# Altium integrated library LED-SMD_V2.IntLib: 212 symbols
Pins are listed as number, name and electrical type; pins without a type are passive.

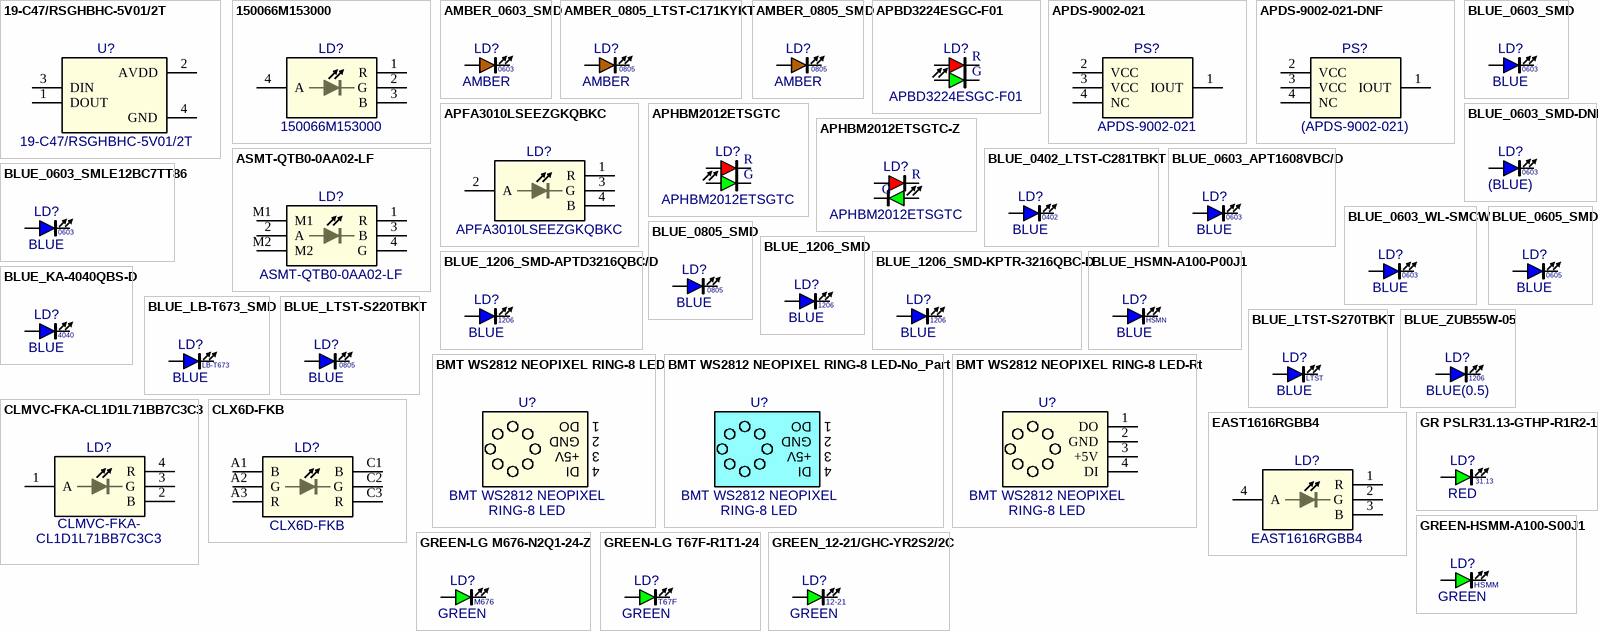
[diagram p0: symbols 19-C47/RSGHBHC-5V01/2T to GREEN_12-21/GHC-YR2S2/2C]

## 19-C47/RSGHBHC-5V01/2T
designator U?
IC Addressable Lighting LED; Manufacturer: Everlight; Package: LED-PLCC4-1.8x1.8-19-C47; EDM-PN: *; Text2: *; Text1: *; Value: 19-C47/RSGHBHC-5V01/2T; SAAB PN: *; DCE Part No: *; Part Number: 19-C47/RSGHBHC-5V01/2T
footprint LED-PLCC4-1.8x1.8-19-C47 (PLCC4 1.8x1.8mm)
pins: 1 DOUT, 2 AVDD, 3 DIN, 4 GND

## 150066M153000
designator LD?
LED Tri Colour RGB; Manufacturer: Wurth; Part Number: 150066M153000; Package: WL-SFCD-0606; EDM-PN: *; SAAB PN: *; DCE Part No: *; Value: 150066M153000
footprint WL-SFCD-0606 (WL-SFCD-0606 1.6x1.6mm)
pins: 1 R, 2 G, 3 B, 4 A

## AMBER_0603_SMD
designator LD?  value AMBER  Text2: 0603  (hidden comment: AMBER_0603_SMD)
LED SMD 0603 Amber; Manufacturer: Various; Part Number: AMBER_0603_SMD; Package: LED0603-AMBER; EDM-PN: *; Text1: *; Reutech PN: *; SAAB PN: *; DCE Part No: *
footprint LED0603-Amber (LED 0603 Amber)
pins: 1 K, 2 A

## AMBER_0805_LTST-C171KYKT
designator LD?, comment value AMBER  Text2: 0805  (hidden comment: LTST-C171KYKT)
LED SMD 0805 Amber; Manufacturer: LITEON; Reutech PN: 5961-LE-0107; Part Number: LTST-C171KYKT; Package: LED0805_Orange; EDM-PN: *; Text1: *; SAAB PN: *; DCE Part No: *
footprint LED0805-Orange (LED, 0805, 2-Leads, Body 2.0x1.3mm, IPC Medium Density)
pins: 1 K, 2 A

## AMBER_0805_SMD
designator LD?  value AMBER  Text2: 0805  (hidden comment: AMBER_0805_SMD)
LED SMD 0805 Amber; Manufacturer: Various; Part Number: AMBER_0805_SMD; Package: LED0805-AMBER; EDM-PN: *; Text1: *; SAAB PN: *; DCE Part No: *
footprint LED0805-AMBER (LED 0805 Amber)
pins: 1 K, 2 A

## APBD3224ESGC-F01
designator LD?
LED SMD Red/Green Bicolor; Manufacturer: Kingbright; Part Number: APBD3224ESGC-F01; Package: LED-DUAL-3.2X2.4; EDM-PN: *; SAAB PN: *; Text1: *; Value: APBD3224ESGC-F01; DCE Part No: *
footprint LED-Dual-3.2x2.4 (LED Dual 3.2x2.4mm)
pins: 1 RA, 2 RK, 3 GA, 4 GK
text: R; G

## APDS-9002-021
designator PS?
Photo Sensor; Manufacturer: Avago; Part Number: APDS-9002-021; Package: ADPS-9002; EDM-PN: *; SAAB PN: *; Value: APDS-9002-021; DCE Part No: *
footprint APDS-9002 (Phot Sensor APDS SMD)
pins: 1 IOUT, 2 VCC (power), 3 VCC, 4 NC

## APDS-9002-021-DNF
designator PS?  value (APDS-9002-021)  (hidden comment: APDS-9002-021-DNF)
Photo Sensor - Do not Fit; Manufacturer: Avago; Part Number: DNF - APDS-9002-021; Package: ADPS-9002; EDM-PN: *; SAAB PN: *; DCE Part No: *
footprint APDS-9002 (Phot Sensor APDS SMD)
pins: 1 IOUT, 2 VCC (power), 3 VCC, 4 NC

## APFA3010LSEEZGKQBKC
designator LD?
LED Tri Colour Rt Angle RGB; Manufacturer: Kingbright; Part Number: APFA3010LSEEZGKQBKC; Package: APFA3010x; EDM-PN: *; SAAB PN: *; Value: APFA3010LSEEZGKQBKC; DCE Part No: *
footprint APFA3010x (APFA3010x Tricolor Right Angle 3.0x1.5mm)
pins: 1 R, 2 A, 3 G, 4 B

## APHBM2012ETSGTC
designator LD?
LED SMD Red/Green Bicolor; Manufacturer: Kingbright; Part Number: APHBM2012ETSGTC; Package: APHBM2012; EDM-PN: *; SAAB PN: *; Text1: *; Value: APHBM2012ETSGTC; DCE Part No: *
footprint APHBM2012 (APHBM2012 2.0x1.25mm)
pins: 1 RA, 2 RK, 3 GK, 4 GA
text: R; G

## APHBM2012ETSGTC-Z
designator LD?, comment APHBM2012ETSGTC
LED SMD Red/Green Bicolor; Manufacturer: Kingbright; Part Number: APHBM2012ETSGTC; Package: APHBM2012; EDM-PN: *; SAAB PN: *; Text1: *; Value: APHBM2012ETSGTC; DCE Part No: *
footprint APHBM2012 (APHBM2012 2.0x1.25mm)
pins: 1 RA, 2 RK, 3 GK, 4 GA
text: R; G

## ASMT-QTB0-0AA02-LF
designator LD?
LED SMD Tri Colour; Manufacturer: Avago; Part Number: ASMT-QTB0-0AA02-LF; Package: ASMT-SMD; EDM-PN: *; SAAB PN: *; Value: ASMT-QTB0-0AA02-LF; DCE Part No: *
footprint ASMT-SMD (Tri-Colour SMD LED)
pins: 1 R, 2 A, 3 B, 4 G, M1, M2

## BLUE_0402_LTST-C281TBKT
designator LD?, comment value BLUE  Text2: 0402  (hidden comment: LTST-C281TBKT)
LED SMD 0402 Blue; Manufacturer: LITEON; Part Number: LTST-C281TBKT; Package: LED0402-Blue; EDM-PN: *; Text1: *; Reutech PN: *; SAAB PN: *; DCE Part No: *
footprint LED0402-Blue (LED 0402 1.0x0.5mm)
pins: 1 K, 2 A

## BLUE_0603_APT1608VBC/D
designator LD?, comment value BLUE  Text2: 0603  (hidden comment: APT1608VBC/D)
LED SMD 0603 Blue; Manufacturer: Kingbright; Part Number: APT1608VBC/D; Package: LED0603-Blue; EDM-PN: *; Text1: *; Reutech PN: *; SAAB PN: *; DCE Part No: *
footprint LED0603-Blue (LED, 0603, 2-Leads, Body 1.6x0.8mm, IPC Medium Density)
pins: 1 K, 2 A

## BLUE_0603_SMD
designator LD?  value BLUE  Text2: 0603  (hidden comment: BLUE_0603_SMD)
LED SMD 0603 Blue; Manufacturer: Various; EDM-PN: LED49; Reutech PN: 5961-LE-0098; Part Number: BLUE_0603_SMD; Package: LED0603-Blue; Text1: *; SAAB PN: *; DCE Part No: *
footprint LED0603-Blue (LED, 0603, 2-Leads, Body 1.6x0.8mm, IPC Medium Density)
pins: 1 K, 2 A

## BLUE_0603_SMD-DNF
designator LD?, comment value (BLUE)  Text2: 0603  (hidden comment: BLUE_0603_SMD)
LED SMD 0603 Blue - Do not Fit; Manufacturer: Various; Part Number: DNT - BLUE_0603; EDM-PN: DNF; Reutech PN: 5961-LE-0098; Package: LED0603-Blue; Text1: *; SAAB PN: *; DCE Part No: *
footprint LED0603-Blue (LED, 0603, 2-Leads, Body 1.6x0.8mm, IPC Medium Density)
pins: 1 K, 2 A

## BLUE_0603_SMLE12BC7TT86
designator LD?, comment value BLUE  Text2: 0603  (hidden comment: SMLE12BC7TT86)
LED SMD 0603 Blue; Manufacturer: Rohm; EDM-PN: LED49; Part Number: SMLE12BC7TT86; Package: LED0603-Blue; Text1: *; Reutech PN: *; SAAB PN: *; DCE Part No: *
footprint LED0603-Blue (LED, 0603, 2-Leads, Body 1.6x0.8mm, IPC Medium Density)
pins: 1 K, 2 A

## BLUE_0603_WL-SMCW
designator LD?  value BLUE  Text2: 0603  (hidden comment: BLUE_0603_WL-SMCW)
LED SMD 0603 Blue 145mcd; Manufacturer: Wurth; Part Number: 150060BS75000; EDM-PN: LED157; Reutech PN: 5961-LE-; Package: WL-SMCW-0603-BLUE; Text1: *; SAAB PN: *; DCE Part No: *
footprint WL-SMCW-0603-BLUE (WL-SMCW-0603-BLUE 1.6x0.8mm)
pins: 1 K, 2 A

## BLUE_0605_SMD
designator LD?, comment value BLUE  Text2: 0605  (hidden comment: BLUE_0605_SMD-Rt)
LED SMD 0605 Blue Rt Angle; Manufacturer: Rohm; Part Number: SML-A12BC7T; Package: LED0605-Blue-Rt; EDM-PN: *; Text1: *; SAAB PN: *; DCE Part No: *
footprint LED0605-Blue-Rt (LED, 0605 1.6x1.15mm)
pins: 1 K, 2 A

## BLUE_0805_SMD
designator LD?  value BLUE  Text2: 0805  (hidden comment: BLUE_0805_SMD)
LED SMD 0805 Blue; Manufacturer: Various; EDM-PN: LED42; Part Number: BLUE_0805_SMD; Package: LED0805-Blue; Text1: *; SAAB PN: *; DCE Part No: *
footprint LED0805-Blue (LED, 0805, 2-Leads, Body 2.0x1.3mm, IPC Medium Density)
pins: 1 K, 2 A

## BLUE_1206_SMD
designator LD?  value BLUE  Text2: 1206  (hidden comment: BLUE_1206_SMD)
LED SMD 1206 Blue; Manufacturer: Various; EDM-PN: LED86; Part Number: BLUE_1206_SMD; Package: LED1206-Blue; Text1: *; SAAB PN: *; DCE Part No: *
footprint LED1206-Blue (LED, 1206, 2-Leads, Body 2.0x1.3mm, IPC Medium Density)
pins: 1 K, 2 A

## BLUE_1206_SMD-APTD3216QBC/D
designator LD?, comment value BLUE  Text2: 1206  (hidden comment: APTD3216QBC/D)
LED SMD 1206 Blue Clear; Manufacturer: Kingbright; Part Number: APTD3216QBC/D; Package: APTD3216-BLUE; EDM-PN: *; Text1: *; SAAB PN: *; DCE Part No: *
footprint APTD3216-BLUE (APTD3216 Blue 3.2x1.6mm)
pins: 1 K, 2 A

## BLUE_1206_SMD-KPTR-3216QBC-D
designator LD?, comment value BLUE  Text2: 1206  (hidden comment: KPTR-3216QBC-D)
LED SMD 1206 Blue Clear Rev Mount; Manufacturer: Kingbright; Part Number: KPTR-3216QBC-D; Package: KPTR3216-BLUE; EDM-PN: *; Text1: *; SAAB PN: *; DCE Part No: *
footprint KPTR3216-BLUE (KPTR3216 3.2x1.6mm)
pins: 1 K, 2 A

## BLUE_HSMN-A100-P00J1
designator LD?  value BLUE  Text2: HSMN  (hidden comment: BLUE_HSMN-A100-P00J1)
LED SMD Blue HSMA (White Body); Manufacturer: Avago; Part Number: HSMN-A100-P00J1; Package: LED-PLCC-2-Blue; EDM-PN: *; Text1: *; SAAB PN: *; DCE Part No: *
footprint LED-PLCC-2-Blue (LED, PLCC2 2-Leads, Body 3.2x2.8mm)
pins: 1 K, 2 A

## BLUE_KA-4040QBS-D
designator LD?  value BLUE  Text2: 4040  (hidden comment: BLUE_KA-4040QBS-D)
LED SMD Blue Rt Angle; Manufacturer: Kingbright; Part Number: KA-4040QBS-D; Package: KA-4040-Blue; EDM-PN: *; Text1: *; SAAB PN: *; DCE Part No: *
footprint KA-4040-Blue
pins: 1 K, 2 A

## BLUE_LB-T673_SMD
designator LD?  value BLUE  Text2: LB-T673  (hidden comment: BLUE_LB-T673_SMD)
LED SMD LB-T673 Blue; Manufacturer: Osram; Part Number: Q65111A1007; Package: LED-PLCC-2-Blue; EDM-PN: *; Text1: *; SAAB PN: *; DCE Part No: *
footprint LED-PLCC-2-Blue (LED, PLCC2 2-Leads, Body 3.2x2.8mm)
pins: 1 K, 2 A

## BLUE_LTST-S220TBKT
designator LD?, comment value BLUE  Text2: 0805  (hidden comment: LTST-S220TBKT)
LED SMD 0805 Blue 470nm; Manufacturer: LITEON; Part Number: LTST-S220TBKT; Package: LTST-S220TBKT; EDM-PN: *; Text1: *; SAAB PN: *; DCE Part No: *
footprint LTST-S220TBKT (LTST-S220TBKT 2.1x1.0mm)
pins: 1 K, 2 A

## BLUE_LTST-S270TBKT
designator LD?  value BLUE  Text2: LTST  (hidden comment: BLUE_LTST-S270TBKT)
LED SMD Blue Rt Angle Water Clear; Manufacturer: LITEON; Part Number: LTST-S270TBKT; Package: LTST-S270TBKT; EDM-PN: *; Text1: *; SAAB PN: *; DCE Part No: *
footprint LTST-S270KRKT (LTST-S270KRKT 1.6x1.15mm)
pins: 1 K, 2 A

## BLUE_ZUB55W-05
designator LD?, comment value BLUE(0.5)  Text2: 1206  (hidden comment: Blue_1206_SMD-05)
LED SMD 1206 Blue; Manufacturer: Nicomatic; Part Number: ZUB55W-05; Package: LED1206-Blue-05; EDM-PN: *; Text1: *; SAAB PN: *; DCE Part No: *
footprint LED1206-Blue-05 (LED, 1206, 2-Leads, Body 2.0x1.3mm, IPC Medium Density)
pins: 1 K, 2 A

## BMT WS2812 NEOPIXEL RING-8 LED
designator U?  Text1: BMT WS2812 NEOPIXEL  Text2: RING-8 LED  (hidden comment: BMT WS2812 NEOPIXEL RING-8 LED)
LED WS2812 NEOPIXEL RING-8; Manufacturer: Various; Package: NEOPIXEL RING-8 LED; EDM-PN: *; Value: BMT WS2812 NEOPIXEL RING-8 LED; SAAB PN: *; Part Number: BMT WS2812 NEOPIXEL RING-8 LED; DCE Part No: *
footprint NEOPIXEL RING-8 LED
text: DO; 1; GND; 2; +5V; 3; DI; 4

## BMT WS2812 NEOPIXEL RING-8 LED-No_Part
designator U?, comment Text1: BMT WS2812 NEOPIXEL  Text2: RING-8 LED  (hidden comment: BMT WS2812 NEOPIXEL RING-8 LED)  (mechanical)
LED WS2812 NEOPIXEL RING-8; Manufacturer: Various; Package: NA; EDM-PN: *; Value: BMT WS2812 NEOPIXEL RING-8 LED; SAAB PN: *; Part Number: BMT WS2812 NEOPIXEL RING-8 LED; DCE Part No: *
text: DO; 1; GND; 2; +5V; 3; DI; 4

## BMT WS2812 NEOPIXEL RING-8 LED-Rt
designator U?, comment Text1: BMT WS2812 NEOPIXEL  Text2: RING-8 LED  (hidden comment: BMT WS2812 NEOPIXEL RING-8 LED)
LED WS2812 NEOPIXEL RING-8, 2555-1X04G, 2100-04P-S-G; Manufacturer: Various; Part Number: BMT WS2812 NEOPIXEL RING-8 LED & 2555-1X04G & 2100-04P-S-G; Package: NEOPIXEL RING-8 LED-RT; EDM-PN: *; Value: BMT WS2812 NEOPIXEL RING-8 LED; SAAB PN: *; DCE Part No: *
footprint NEOPIXEL RING-8 LED-RT (NEOPIXEL RING-8 LED)
pins: 1 DO, 2 GND, 3 +5V, 4 DI

## CLMVC-FKA-CL1D1L71BB7C3C3
designator LD?  Text2: CL1D1L71BB7C3C3  Text1: CLMVC-FKA-  (hidden comment: CLMVC-FKA-CL1D1L71BB7C3C3)
LED Tri Colour RGB; Manufacturer: Cree; Part Number: CLMVC-FKA-CL1D1L71BB7C3C3; Package: LED-PLCC4-2.0x2.0-0.9; EDM-PN: *; SAAB PN: *; Value: CLMVC-FKA-CL1D1L71BB7C3C3; DCE Part No: *
footprint LED-PLCC4-2.0x2.0-0.9 (PLCC4 2.0x2.0mm)
pins: 1 A, 2 B, 3 G, 4 R

## CLX6D-FKB
designator LD?
LED Tri Colour BL/GRN/RED; Manufacturer: Cree; Part Number: CLX6D-FKB-CN1R1H1BB7D3D3; Package: LED-PLCC6-3x3-BGR-CREE; EDM-PN: *; SAAB PN: *; Value: CLX6D-FKB; DCE Part No: *
footprint LED-PLCC6-3x3-BGR-Cree (PLCC6 BGR BGR 3.4x3.4mm)
pins: A1 B, A2 G, A3 R, C1 B, C2 G, C3 R

## EAST1616RGBB4
designator LD?
LED Tri Colour RGB; Manufacturer: Everlight; EDM-PN: LED193; Part Number: EAST1616RGBB4; Package: EAST1616; SAAB PN: *; Value: EAST1616RGBB4; DCE Part No: *
footprint EAST1616 (EAST1616 1.6x1.6mm)
pins: 1 R, 2 G, 3 B, 4 A

## GR PSLR31.13-GTHP-R1R2-1
designator LD?  value RED  Text2: 31.13  (hidden comment: GR PSLR31.13-GTHP-R1R2-1)
LED Lighting Color DURIS Red 620nm; Manufacturer: Osram; Part Number: GR PSLR31.13-GTHP-R1R2-1; Package: GR PSLR31.13; EDM-PN: *; Reutech PN: *; Text1: *; SAAB PN: *; DCE Part No: *
footprint GR PSLR31.13 (GR PSLR31.13 3.0x3.0mm)
pins: 1 K, 2 A

## GREEN-HSMM-A100-S00J1
designator LD?, comment value GREEN  Text2: HSMM  (hidden comment: HSMM-A100-S00J1)
LED Green SMD High-Bright; Manufacturer: Avago; Part Number: HSMM-A100-S00J1; Package: LED-PLCC-2-GREEN; EDM-PN: *; Text1: *; SAAB PN: *; DCE Part No: *
footprint LED-PLCC-2-GREEN (LED, PLCC2 2-Leads, Body 3.2x2.8mm)
pins: 1 K, 2 A

## GREEN-LG M676-N2Q1-24-Z
designator LD?, comment value GREEN  Text2: M676  (hidden comment: LG M676-N2Q1-24-Z)
LED Green SMD; Manufacturer: Osram; EDM-PN: LED164; Part Number: LG M676-N2Q1-24-Z; Package: 2-SMD-J-Lead-GREEN; Text1: *; SAAB PN: *; DCE Part No: *
footprint 2-SMD-J-Lead-GREEN (2-SMD-J-Lead 2.3x2.5mm)
pins: 1 K, 2 A

## GREEN-LG T67F-R1T1-24
designator LD?, comment value GREEN  Text2: T67F  (hidden comment: LG T67F-R1T1-24)
LED Green SMD; Manufacturer: Osram; Part Number: LG T67F-R1T1-24; Package: LED-PLCC-2-GREEN; EDM-PN: *; Text1: *; SAAB PN: *; DCE Part No: *
footprint LED-PLCC-2-GREEN (LED, PLCC2 2-Leads, Body 3.2x2.8mm)
pins: 1 K, 2 A

## GREEN_12-21/GHC-YR2S2/2C
designator LD?, comment value GREEN  Text2: 12-21  (hidden comment: 12-21/GHC-YR2S2/2C)
LED SMD Right Angle Green; Manufacturer: Everlight; DCE Part No: 9436; Part Number: 12-21/GHC-YR2S2/2C; Package: LED-RT-3.0X2.0MM-Green; EDM-PN: *; SAAB PN: *; Text1: *
footprint LED-RT-3.0X2.0MM-Green (LED-RT 3.0x2.0mm Green)
pins: 1 K, 2 A, 3 MT hidden

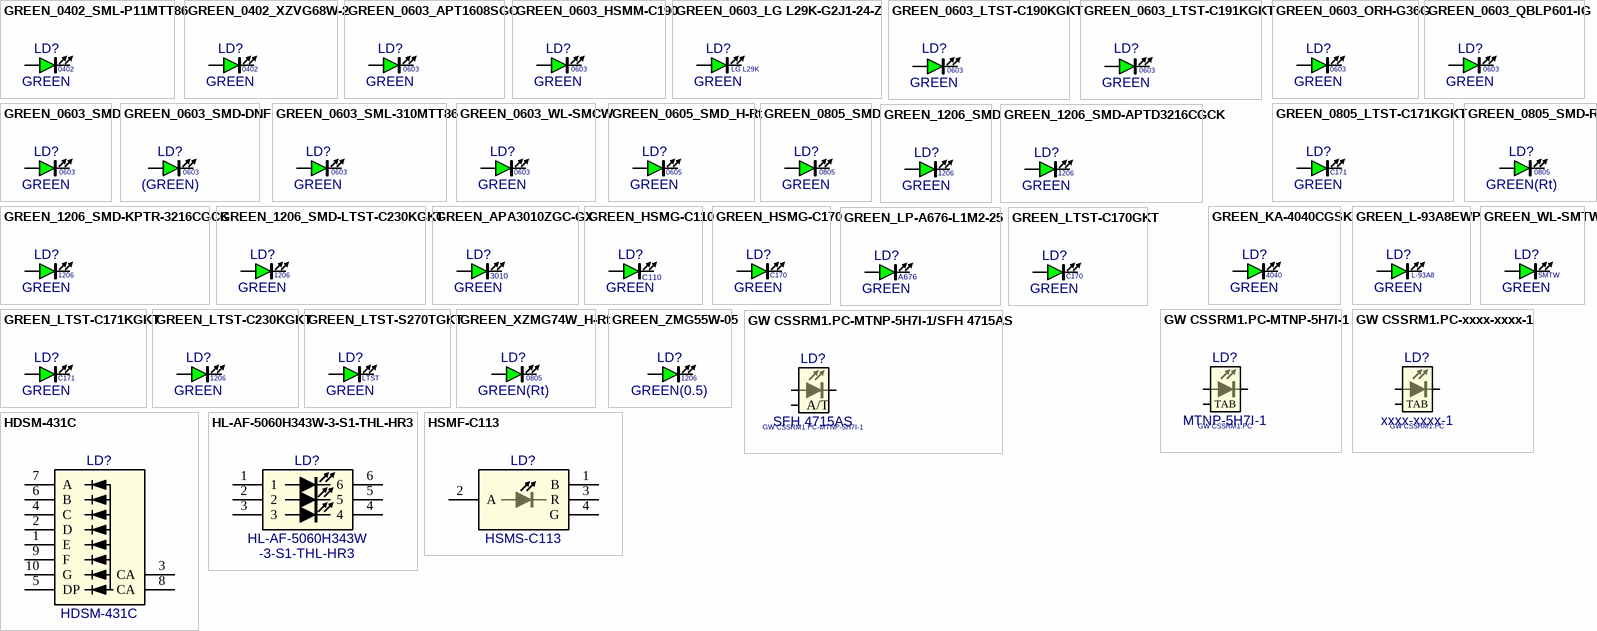
[diagram p1: symbols GREEN_0402_SML-P11MTT86 to HSMF-C113]

## GREEN_0402_SML-P11MTT86
designator LD?, comment value GREEN  Text2: 0402  (hidden comment: GREEN_0402_SMD)
LED SMD 0402 Green; Manufacturer: Rohm; Part Number: SML-P11MTT86; Package: LED00402-SML-P11-GREEN; EDM-PN: *; Text1: *; Reutech PN: *; SAAB PN: *; DCE Part No: *
footprint LED00402-SML-P11-Green (LED 0402 1.0x0.5mm)
pins: 1 K, 2 A

## GREEN_0402_XZVG68W-2
designator LD?, comment value GREEN  Text2: 0402  (hidden comment: XZVG68W-2)
LED SMD 0402 Green; Manufacturer: Sunled; EDM-PN: LED153; SAAB PN: 1AYC00118AEA; Part Number: XZVG68W-2; Package: LED0402-GREEN; Text1: *; Reutech PN: *; DCE Part No: *
footprint LED0402-GREEN (LED 0402 1.0x0.5mm)
pins: 1 K, 2 A

## GREEN_0603_APT1608SGC
designator LD?, comment value GREEN  Text2: 0603  (hidden comment: APT1608SGC)
LED SMD 0603 Green; Manufacturer: Kingbright; Reutech PN: 5961-LE-*; Part Number: APT1608SGC; Package: LED0603-Green; EDM-PN: *; Text1: *; SAAB PN: *; DCE Part No: *
footprint LED0603-Green (LED, 0603, 2-Leads, Body 1.6x0.8mm, IPC Medium Density)
pins: 1 K, 2 A

## GREEN_0603_HSMM-C190
designator LD?, comment value GREEN  Text2: 0603  (hidden comment: HSMM-C190)
LED SMD 0603 Green; Manufacturer: Avago; EDM-PN: LED67; Reutech PN: 5961-LE-0097; Part Number: HSMM-C190; Package: LED0603-Green; Text1: *; SAAB PN: *; DCE Part No: *
footprint LED0603-Green (LED, 0603, 2-Leads, Body 1.6x0.8mm, IPC Medium Density)
pins: 1 K, 2 A

## GREEN_0603_LG L29K-G2J1-24-Z
designator LD?  value GREEN  Text2: LG L29K  (hidden comment: GREEN_0603_LG L29K-G2J1-24-Z)
LED SMD 0603 Green; Manufacturer: Osram; Part Number: LG L29K-G2J1-24-Z; Package: LED0603-Green; EDM-PN: *; Text1: *; SAAB PN: *; DCE Part No: *
footprint LED0603-Green (LED, 0603, 2-Leads, Body 1.6x0.8mm, IPC Medium Density)
pins: 1 K, 2 A

## GREEN_0603_LTST-C190KGKT
designator LD?, comment value GREEN  Text2: 0603  (hidden comment: LTST-C190KGKT)
LED SMD 0603 Green 571nm 2V; Manufacturer: LITEON; Part Number: LTST-C190KGKT; Package: LED0603-Green; EDM-PN: *; Text1: *; Reutech PN: *; SAAB PN: *; DCE Part No: *
footprint LED0603-Green (LED, 0603, 2-Leads, Body 1.6x0.8mm, IPC Medium Density)
pins: 1 K, 2 A

## GREEN_0603_LTST-C191KGKT
designator LD?, comment value GREEN  Text2: 0603  (hidden comment: LTST-C191KGKT)
LED SMD 0603 Bright Green; Manufacturer: LITEON; Part Number: LTST-C191KGKT; Package: LED0603-Green; EDM-PN: *; Text1: *; Reutech PN: *; SAAB PN: *; DCE Part No: *
footprint LED0603-Green (LED, 0603, 2-Leads, Body 1.6x0.8mm, IPC Medium Density)
pins: 1 K, 2 A

## GREEN_0603_ORH-G36G
designator LD?, comment value GREEN  Text2: 0603  (hidden comment: ORH-G36G)
LED SMD 0603 Green; Manufacturer: Orient; EDM-PN: LED215; Part Number: ORH-G36G; Package: LED0603-GREEN-0.4; Text1: *; Reutech PN: *; SAAB PN: *; DCE Part No: *
footprint LED0603-GREEN-0.4 (LED 0603 Green 1.6x0.8mm)
pins: 1 K, 2 A

## GREEN_0603_QBLP601-IG
designator LD?, comment value GREEN  Text2: 0603  (hidden comment: GREEN_0603_SMD)
LED SMD 0603 Green; Manufacturer: QTB; Part Number: QBLP601-IG; Package: LED0603-Green; EDM-PN: *; Text1: *; Reutech PN: *; SAAB PN: *; DCE Part No: *
footprint LED0603-Green (LED, 0603, 2-Leads, Body 1.6x0.8mm, IPC Medium Density)
pins: 1 K, 2 A

## GREEN_0603_SMD
designator LD?  value GREEN  Text2: 0603  (hidden comment: GREEN_0603_SMD)
LED SMD 0603 Green; Manufacturer: Various; EDM-PN: LED67; Reutech PN: 5961-LE-0097; SAAB PN: 1AYC00041AEA; Part Number: GREEN_0603_SMD; Package: LED0603-Green; Text1: *; DCE Part No: *
footprint LED0603-Green (LED, 0603, 2-Leads, Body 1.6x0.8mm, IPC Medium Density)
pins: 1 K, 2 A

## GREEN_0603_SMD-DNF
designator LD?, comment value (GREEN)  Text2: 0603  (hidden comment: GREEN_0603_SMD)
LED SMD 0603 Green - Do not Fit; Manufacturer: Various; Part Number: DNF - GREEN_0603; EDM-PN: DNF; Reutech PN: 5961-LE-0097; SAAB PN: 1AYC00041AEA; Package: LED0603-Green; Text1: *; DCE Part No: *
footprint LED0603-Green (LED, 0603, 2-Leads, Body 1.6x0.8mm, IPC Medium Density)
pins: 1 K, 2 A

## GREEN_0603_SML-310MTT86
designator LD?, comment value GREEN  Text2: 0603  (hidden comment: SML-310MTT86)
LED SMD 0603 Green; Manufacturer: Rohm; EDM-PN: LED46; Part Number: SML-310MTT86; Package: LED0603-Green; Text1: *; Reutech PN: *; SAAB PN: *; DCE Part No: *
footprint LED0603-Green (LED, 0603, 2-Leads, Body 1.6x0.8mm, IPC Medium Density)
pins: 1 K, 2 A

## GREEN_0603_WL-SMCW
designator LD?  value GREEN  Text2: 0603  (hidden comment: GREEN_0603_WL-SMCW)
LED SMD 0603 Green 430mcd; Manufacturer: Wurth; Part Number: 150060GS75000; EDM-PN: LED158; Reutech PN: 5961-LE-; Package: WL-SMCW-0603-GREEN; Text1: *; SAAB PN: *; DCE Part No: *
footprint WL-SMCW-0603-GREEN (WL-SMCW-0603-GREEN 1.6x0.8mm)
pins: 1 K, 2 A

## GREEN_0605_SMD_H-Rt
designator LD?, comment value GREEN  Text2: 0605  (hidden comment: GREEN_0605_SMD-Rt)
LED SMD 0605 Green Rt Angle; Manufacturer: Rohm; Part Number: SML-A12P8T; Package: LED0605-Green-Rt; EDM-PN: *; Text1: *; SAAB PN: *; DCE Part No: *
footprint LED0605-Green-Rt (LED, 0605 1.6x1.15mm)
pins: 1 K, 2 A

## GREEN_0805_LTST-C171KGKT
designator LD?, comment value GREEN  Text2: C171  (hidden comment: GREEN_LTST-0805_SMD)
LED SMD 0805 Green; Manufacturer: LITEON; Part Number: LTST-C171KGKT; Reutech PN: 5961-LE-0106; Package: LED0805-Green; EDM-PN: *; Text1: *; SAAB PN: *; DCE Part No: *
footprint LED0805-Green (LED, 0805, 2-Leads, Body 2.0x1.3mm, IPC Medium Density)
pins: 1 K, 2 A

## GREEN_0805_SMD
designator LD?  value GREEN  Text2: 0805  (hidden comment: GREEN_0805_SMD)
LED SMD 0805 Green; Manufacturer: Various; EDM-PN: LED17; Part Number: GREEN_0805_SMD; Package: LED0805-Green; Text1: *; SAAB PN: *; DCE Part No: *
footprint LED0805-Green (LED, 0805, 2-Leads, Body 2.0x1.3mm, IPC Medium Density)
pins: 1 K, 2 A

## GREEN_0805_SMD-Rt
designator LD?, comment value GREEN(Rt)  Text2: 0805  (hidden comment: GREEN_0805_SMD-RT)
LED SMD 0805 Green Rt Angle; Manufacturer: Various; Part Number: GREEN_0805_Rt; Package: LED0805-Green-Rt; EDM-PN: *; Text1: *; SAAB PN: *; DCE Part No: *
footprint LED0805-Green-RT (LED0805 Green Rt 2.1x1.0mm)
pins: 1 K, 2 A

## GREEN_1206_SMD
designator LD?  value GREEN  Text2: 1206  (hidden comment: GREEN_1206_SMD)
LED SMD 1206 Green; Manufacturer: Various; EDM-PN: LED9; Part Number: GREEN_1206_SMD; Package: LED1206-Green; Text1: *; SAAB PN: *; DCE Part No: *
footprint LED1206-Green (LED, 1206, 2-Leads, Body 2.0x1.3mm, IPC Medium Density)
pins: 1 K, 2 A

## GREEN_1206_SMD-APTD3216CGCK
designator LD?, comment value GREEN  Text2: 1206  (hidden comment: APTD3216CGCK)
LED SMD 1206 Green Clear; Manufacturer: Kingbright; Part Number: APTD3216CGCK; Package: APTD3216-GREEN; EDM-PN: *; Text1: *; SAAB PN: *; DCE Part No: *
footprint APTD3216-GREEN (APTD3216 Green 3.2x1.6mm)
pins: 1 K, 2 A

## GREEN_1206_SMD-KPTR-3216CGCK
designator LD?, comment value GREEN  Text2: 1206  (hidden comment: KPTR-3216CGCK)
LED SMD 1206 Green Clear Rev Mount; Manufacturer: Kingbright; Part Number: KPTR-3216CGCK; Package: KPTR3216-GREEN; EDM-PN: *; Text1: *; SAAB PN: *; DCE Part No: *
footprint KPTR3216-GREEN (KPTR3216 3.2x1.6mm)
pins: 1 K, 2 A

## GREEN_1206_SMD-LTST-C230KGKT
designator LD?, comment value GREEN  Text2: 1206  (hidden comment: LTST-C230KGKT)
LED SMD 1206 Green 2V 571nm; Manufacturer: Lite-On; Part Number: LTST-C230KGKT; Package: LED1206-Green; EDM-PN: *; Text1: *; SAAB PN: *; DCE Part No: *
footprint LED1206-Green (LED, 1206, 2-Leads, Body 2.0x1.3mm, IPC Medium Density)
pins: 1 K, 2 A

## GREEN_APA3010ZGC-GX
designator LD?, comment value GREEN  Text2: 3010  (hidden comment: APA3010ZGC-GX)
LED SMD Right Angle Green; Manufacturer: Kingbright; Part Number: APA3010ZGC-GX; Package: APA3010-Green; EDM-PN: *; SAAB PN: *; Text1: *; DCE Part No: *
footprint APA3010-Green (LED-RT 3.0x2.0mm Green)
pins: 1 K, 2 A, 3 MT hidden

## GREEN_HSMG-C110
designator LD?, comment value GREEN  Text2: C110  (hidden comment: HSMG-C110)
LED SMD Right Angle Green; Manufacturer: Avago; Part Number: HSMG-C110; Package: HSM-C110-SMD; EDM-PN: *; SAAB PN: *; Text1: *; DCE Part No: *
footprint HSM-C110-SMD-Rt (Surface Mount CHIP LED - Rt Angle)
pins: 1 K, 2 A, 3 MT hidden

## GREEN_HSMG-C170
designator LD?, comment value GREEN  Text2: C170  (hidden comment: HSMG-C170)
LED SMD 0805 Green; Manufacturer: Avago; Part Number: HSMG-C170; Package: LED0805-Green; EDM-PN: *; Text1: *; SAAB PN: *; DCE Part No: *
footprint LED0805-Green (LED, 0805, 2-Leads, Body 2.0x1.3mm, IPC Medium Density)
pins: 1 K, 2 A

## GREEN_KA-4040CGSK
designator LD?  value GREEN  Text2: 4040  (hidden comment: GREEN_KA-4040CGSK)
LED SMD Green Rt Angle; Manufacturer: Kingbright; Part Number: KA-4040CGSK; Package: KA-4040-Green; EDM-PN: *; Text1: *; SAAB PN: *; DCE Part No: *
footprint KA-4040-Green
pins: 1 K, 2 A

## GREEN_L-93A8EWP
designator LD?, comment value GREEN  Text2: L-93A8  (hidden comment: GREEN_L-93A8EWP/1GD/TG-0L)
LED Green 3mm Rt Angle SMD; Manufacturer: Kingbright; Part Number: L-93A8EWP/1GD/TG-0L; Package: LED3MM-6.3x4.3-GRN; EDM-PN: *; Text1: *; SAAB PN: *; DCE Part No: *
footprint LED3MM-6.3X4.3-GRN (LEd 3mm  6.3x4.3mm)
pins: 1 K, 2 A

## GREEN_LP-A676-L1M2-25
designator LD?, comment value GREEN  Text2: A676  (hidden comment: LP-A676-L1M2-25)
LED Green Right Angle; Manufacturer: Osram; Part Number: LP-A676-L1M2-25; Package: LED-LX676-Green; EDM-PN: *; Text1: *; SAAB PN: *; DCE Part No: *
footprint LED-LX676-Green (LED, LX 676 2-Leads, Body 4.2x4.2mm)
pins: 1 K, 2 A

## GREEN_LTST-C170GKT
designator LD?  value GREEN  Text2: C170  (hidden comment: GREEN_LTST-C170GKT)
LED SMD 0805 Green; Manufacturer: LITEON; Part Number: LTST-C170GKT; Package: LED0805-Green-1.1; EDM-PN: *; Text1: *; SAAB PN: *; DCE Part No: *
footprint LED0805-Green-1.1 (LED, 0805, 2-Leads, Body 2.0x1.3mm, IPC Medium Density)
pins: 1 K, 2 A

## GREEN_LTST-C171KGKT
designator LD?, comment value GREEN  Text2: C171  (hidden comment: LTST-C171KGKT)
LED SMD 0805 Green; Manufacturer: LITEON; Reutech PN: 5961-LE-0106; Part Number: LTST-C171KGKT; Package: LED0805-Green; EDM-PN: *; Text1: *; SAAB PN: *; DCE Part No: *
footprint LED0805-Green (LED, 0805, 2-Leads, Body 2.0x1.3mm, IPC Medium Density)
pins: 1 K, 2 A

## GREEN_LTST-C230KGKT
designator LD?, comment value GREEN  Text2: 1206  (hidden comment: LTST-C230KGKT)
LED SMD 1206 Green 2V 571nm; Manufacturer: Lite-On; Part Number: LTST-C230KGKT; Package: LED1206-Green; EDM-PN: *; Text1: *; SAAB PN: *; DCE Part No: *
footprint LED1206-Green (LED, 1206, 2-Leads, Body 2.0x1.3mm, IPC Medium Density)
pins: 1 K, 2 A

## GREEN_LTST-S270TGKT
designator LD?  value GREEN  Text2: LTST  (hidden comment: GREEN_LTST-S270TGKT)
LED SMD Red Rt Angle Water Clear; Manufacturer: LITEON; Part Number: LTST-S270TGKT; Package: LTST-S270TGKT; EDM-PN: *; Text1: *; SAAB PN: *; DCE Part No: *
footprint LTST-S270KRKT (LTST-S270KRKT 1.6x1.15mm)
pins: 1 K, 2 A

## GREEN_WL-SMTW
designator LD?  value GREEN  Text2: SMTW  (hidden comment: GREEN_WL-SMTW)
LED WL-SMTW Green; Manufacturer: Wutrh; Part Number: 150141GS73100; Package: LED-WL-SMTW-RED; EDM-PN: *; Text1: *; SAAB PN: *; DCE Part No: *
footprint LED-WL-SMTW-GRN (LED WL-SMTW Body 3.2x2.8mm)
pins: 1 K, 2 A

## GREEN_XZMG74W_H-Rt
designator LD?, comment value GREEN(Rt)  Text2: 0805  (hidden comment: GREEN_XZMG74W)
LED SMD 0805 Green Rt Angle; Manufacturer: Sunled; Part Number: XZMG74W; Package: LED0805-Green-Rt; EDM-PN: *; Text1: *; SAAB PN: *; DCE Part No: *
footprint LED0805-Green-RT (LED0805 Green Rt 2.1x1.0mm)
pins: 1 K, 2 A

## GREEN_ZMG55W-05
designator LD?, comment value GREEN(0.5)  Text2: 1206  (hidden comment: Green_1206_SMD-05)
LED SMD 1206 Green; Manufacturer: Nicomatic; Part Number: ZMG55W-05; Package: LED1206-Green-05; EDM-PN: *; Text1: *; SAAB PN: *; DCE Part No: *
footprint LED1206-Green-05 (LED, 1206, 2-Leads, Body 2.0x1.3mm, IPC Medium Density)
pins: 1 K, 2 A

## GW CSSRM1.PC-MTNP-5H7I-1
designator LD?  value MTNP-5H7I-1  Text2: GW CSSRM1.PC  (hidden comment: GW CSSRM1.PC-MTNP-5H7I-1)
LED Oslon Square; Manufacturer: Osram; Part Number: Q65111A5845; Package: GW CSSRM1.PC; EDM-PN: *; Text1: *; SAAB PN: *; DCE Part No: *
footprint GW CSSRM1.PC (GW CSSRM1.PC 3.0x3.0mm)
pins: 1 K, 2 A, 3 TAB

## GW CSSRM1.PC-MTNP-5H7I-1/SFH 4715AS
designator LD?  value SFH 4715AS  Text2: GW CSSRM1.PC-MTNP-5H7I-1  (hidden comment: GW CSSRM1.PC-MTNP-5H7I-1/SFH 4715AS)
LED IR lightsource; Manufacturer: Osram; Part Number: GW CSSRM1.PC-MTNP-5H7I-1/SFH 4715AS; Package: SFH4715AS; EDM-PN: *; Text1: *; SAAB PN: *; DCE Part No: *
footprint SFH4715AS (SFH4715AS 3.85x3.85mm)
pins: 1 K, 2 A, 3 A/T

## GW CSSRM1.PC-xxxx-xxxx-1
designator LD?  value xxxx-xxxx-1  Text2: GW CSSRM1.PC  (hidden comment: GW CSSRM1.PC-xxxx-xxxx-1)
LED Oslon Square; Manufacturer: Osram; Part Number: Q65111A584x; Package: GW CSSRM1.PC; EDM-PN: *; Text1: *; SAAB PN: *; DCE Part No: *
footprint GW CSSRM1.PC (GW CSSRM1.PC 3.0x3.0mm)
pins: 1 K, 2 A, 3 TAB

## HDSM-431C
designator LD?
LED 7-Segment 0.39" Red; Manufacturer: Avago; Part Number: HDSM-431C; Package: HDSM-431C; EDM-PN: *; Value: HDSM-431C; DCE Part No: *
footprint HDSM-431C (HDSM-431C 9.8x15.0mm)
pins: 1 E, 2 D, 3 CA, 4 C, 5 DP, 6 B, 7 A, 8 CA, 9 F, 10 G

## HL-AF-5060H343W-3-S1-THL-HR3
designator LD?  Text2: -3-S1-THL-HR3  Text1: HL-AF-5060H343W  (hidden comment: HL-AF-5060H343W-3-S1-THL-HR3)
LED White SMD 5x5x1.6mm ROHS; Manufacturer: HONGLITRONIC (LCSC); Part Number: HL-AF-5060H343W-3-S1-THL-HR3; Package: LED-PLCC6-5x5; EDM-PN: *; SAAB PN: *; DCE Part No: *; Value: HL-AF-5060H343W-3-S1-THL-HR3
footprint LED-PLCC6-5x5 (PLCC6 5.0x5.0mm)
pins: 1, 2, 3, 4, 5, 6

## HSMF-C113
designator LD?  value HSMS-C113  (hidden comment: HSMF-C113)
LED SMD Right Angle Tricolor; Manufacturer: Avago; Text1: RED/GREEN/BLUE; Part Number: HSMF-C113; Package: HSMF-C113-5; EDM-PN: *; SAAB PN: *; DCE Part No: *
footprint HSMF-C113-5 (LED Tricolor Right Angle)
pins: 1 B, 2 A, 3 R, 4 G

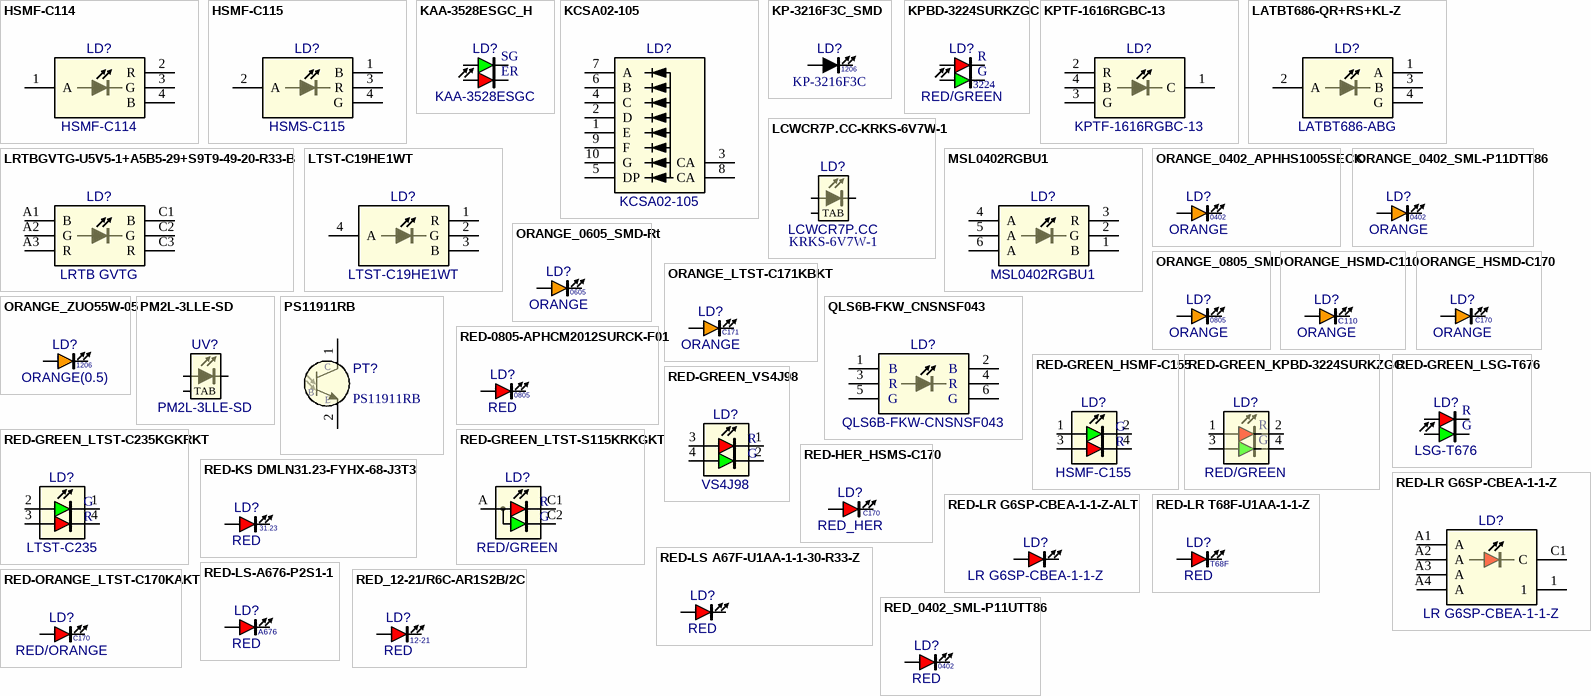
[diagram p2: symbols HSMF-C114 to RED_0402_SML-P11UTT86]

## HSMF-C114
designator LD?
LED Tri Colour; Manufacturer: Avago; Part Number: HSMF-C114; Package: HSMF-C114; EDM-PN: *; SAAB PN: *; Value: HSMF-C114; DCE Part No: *
footprint HSMF-C114 (HSMF-C114 1.6x1.5mm)
pins: 1 A, 2 R, 3 G, 4 B

## HSMF-C115
designator LD?  value HSMS-C115  (hidden comment: HSMF-C115)
LED SMD Right Angle Tricolor; Manufacturer: Avago; Text1: RED/GREEN/BLUE; Part Number: HSMF-C115; Package: HSMF-C113-5; EDM-PN: *; SAAB PN: *; DCE Part No: *
footprint HSMF-C113-5 (LED Tricolor Right Angle)
pins: 1 B, 2 A, 3 R, 4 G

## KAA-3528ESGC_H
designator LD?, comment KAA-3528ESGC
LED SMD Red/SB Green Bicolor; Manufacturer: Kingbright; Part Number: KAA-3528ESGC; Package: LED-DUAL-3.5X2.8; EDM-PN: *; SAAB PN: *; Text1: *; Value: KAA-3528ESGC; DCE Part No: *
footprint LED-Dual-3.5x2.8 (LED Dual 3.5x2.8mm)
pins: 1 RK, 2 RA, 3 GK, 4 GA
text: SG; ER

## KCSA02-105
designator LD?
LED 7-Segment 0.2" Red; Manufacturer: Kingbright; Part Number: KCSA02-105; Package: KCSA02-105; EDM-PN: *; Value: KCSA02-105; DCE Part No: *
footprint KCSA02-105 (KCSA02-105 6.9x10mm)
pins: 1 E, 2 D, 3 CA, 4 C, 5 DP, 6 B, 7 A, 8 CA, 9 F, 10 G

## KP-3216F3C_SMD
designator LD?, comment Text2: 1206  (hidden comment: KP-3216F3C)
IR Emmiting Diode; Manufacturer: Kingbright; Package: LED1206-WHITE; EDM-PN: *; Text1: *; Value: KP-3216F3C; SAAB PN: *; Part Number: KP-3216F3C; DCE Part No: *
footprint LED1206-White (LED, 1206, 2-Leads, Body 2.0x1.3mm, IPC Medium Density)
pins: 1 K, 2 A

## KPBD-3224SURKZGC
designator LD?  Text2: 3224  Text1: RED/GREEN  (hidden comment: KPBD-3224SURKZGC)
LED SMD Red/Green Bicolor; Manufacturer: Kingbright; Part Number: KPBD-3224SURKZGC; Package: LED-DUAL-3.2X2.4; EDM-PN: *; Value: KPBD-3224SURKZGC; SAAB PN: *; DCE Part No: *
footprint LED-Dual-3.2x2.4 (LED Dual 3.2x2.4mm)
pins: 1 RA, 2 RK, 3 GA, 4 GK
text: R; G

## KPTF-1616RGBC-13
designator LD?
LED Tri Colour; Manufacturer: Kingbright; Part Number: KPTF-1616RGBC-13; Package: KPTF-1616RGBC-13; EDM-PN: *; SAAB PN: *; Value: KPTF-1616RGBC-13; DCE Part No: *
footprint KPTF-1616RGBC-13 (KPTF-1616RGBC-13 1.6x1.6mm)
pins: 1 C, 2 R, 3 G, 4 B

## LATBT686-QR+RS+KL-Z
designator LD?  value LATBT686-ABG  (hidden comment: LATBT686-QR+RS+KL-Z)
LED Tri Colour AMB/BL/GRN; Manufacturer: Osram; Part Number: LATBT686-QR+RS+KL-Z; Package: LED-PLCC4-4-3.4x3.0; EDM-PN: *; SAAB PN: *; DCE Part No: *
footprint LED-PLCC4-4-3.4x3.0 (LED, PLCC2 2-Leads, Body 3.2x2.8mm)
pins: 1 A, 2 A, 3 B, 4 G

## LCWCR7P.CC-KRKS-6V7W-1
designator LD?  Text1: LCWCR7P.CC  Text2: KRKS-6V7W-1  (hidden comment: LCWCR7P.CC-KRKS-6V7W-1)
LED Oslon Square; Manufacturer: Osram; Part Number: LCWCR7P.CC-KRKS-6V7W-1; Package: GW CSSRM1.PC; EDM-PN: *; Value: LCWCR7P.CC-KRKS-6V7W-1; SAAB PN: *; DCE Part No: *
footprint GW CSSRM1.PC (GW CSSRM1.PC 3.0x3.0mm)
pins: 1 K, 2 A, 3 TAB

## LRTBGVTG-U5V5-1+A5B5-29+S9T9-49-20-R33-B
designator LD?  value LRTB GVTG  (hidden comment: LRTBGVTG-U5V5-1+A5B5-29+S9T9-49-20-R33-B)
LED Tri Colour BL/GRN/RED; Manufacturer: Osram; Part Number: Q65111A3112; Package: LED-PLCC6-3x3-BGR-BLK; EDM-PN: *; SAAB PN: *; DCE Part No: *
footprint LED-PLCC6-3x3-BGR-BLK (PLCC6 BGR BGR 3.0x3.3mm)
pins: A1 B, A2 G, A3 R, C1 B, C2 G, C3 R

## LTST-C19HE1WT
designator LD?
LED Tri Colour RGB; Manufacturer: LITEON; EDM-PN: LED140; Part Number: LTST-C19HE1WT; Package: LTST-C19HE1WT; SAAB PN: *; Value: LTST-C19HE1WT; DCE Part No: *
footprint LTST-C19HE1WT (LTST-C19HE1WT 1.6x1.5mm)
pins: 1 R, 2 G, 3 B, 4 A

## MSL0402RGBU1
designator LD?
LED Tri Colour RGB - 2.1V Red, 3.5V Green, 3.3V Blue; Manufacturer: Rohm; Part Number: MSL0402RGBU1; Package: MLS0402RGB; EDM-PN: *; SAAB PN: *; Value: MSL0402RGBU1; DCE Part No: *
footprint MLS0402RGB (MLS0402RGB 1.6x1.8mm)
pins: 1 B, 2 G, 3 R, 4 A, 5 A, 6 A

## ORANGE_0402_APHHS1005SECK
designator LD?, comment value ORANGE  Text2: 0402  (hidden comment: APHHS1005SECK)
LED SMD 0402 Orange; Manufacturer: Kingbright; Part Number: APHHS1005SECK; Package: LED0402-ORANGE-APHHS1005; EDM-PN: *; Text1: *; Reutech PN: *; SAAB PN: *; DCE Part No: *
footprint LED0402-ORANGE-APHHS1005 (APHHS1005 1.0x0.5mm)
pins: 1 K, 2 A

## ORANGE_0402_SML-P11DTT86
designator LD?, comment value ORANGE  Text2: 0402  (hidden comment: ORANGE_0402_SMD)
LED SMD 0402 Orange; Manufacturer: Rohm; Part Number: SML-P11DTT86; Package: LED00402-SML-P11-ORANGE; EDM-PN: *; Text1: *; Reutech PN: *; SAAB PN: *; DCE Part No: *
footprint LED00402-SML-P11-Orange (LED 0402 1.0x0.5mm)
pins: 1 K, 2 A

## ORANGE_0605_SMD-Rt
designator LD?  value ORANGE  Text2: 0605  (hidden comment: ORANGE_0605_SMD-Rt)
LED SMD 0605 Orange Rt Angle; Manufacturer: Rohm; Part Number: SML-A12DT; Package: LED0605-Orange-Rt; EDM-PN: *; Text1: *; SAAB PN: *; DCE Part No: *
footprint LED0605-Orange-Rt (LED, 0605 1.6x1.15mm)
pins: 1 K, 2 A

## ORANGE_0805_SMD
designator LD?  value ORANGE  Text2: 0805  (hidden comment: ORANGE_0805_SMD)
LED SMD 0805 Orange; Manufacturer: Various; Part Number: LED 0805 Orange; EDM-PN: LED220; Package: LED0805-ORANGE; Text1: *; SAAB PN: *; DCE Part No: *
footprint LED0805-Orange (LED, 0805, 2-Leads, Body 2.0x1.3mm, IPC Medium Density)
pins: 1 K, 2 A

## ORANGE_HSMD-C110
designator LD?, comment value ORANGE  Text2: C110  (hidden comment: HSMD-C110)
LED SMD Right Angle Orange; Manufacturer: Avago; Part Number: HSMD-C110; Package: HSM-C110-SMD; EDM-PN: *; SAAB PN: *; Text1: *; DCE Part No: *
footprint HSM-C110-SMD-Rt (Surface Mount CHIP LED - Rt Angle)
pins: 1 K, 2 A, 3 MT hidden

## ORANGE_HSMD-C170
designator LD?  value ORANGE  Text2: C170  (hidden comment: ORANGE_HSMD-C170)
LED SMD 0805 Orange; Manufacturer: Avago; Part Number: HSMD-C170; Package: LED0805-Orange; EDM-PN: *; Text1: *; SAAB PN: *; DCE Part No: *
footprint LED0805-Orange (LED, 0805, 2-Leads, Body 2.0x1.3mm, IPC Medium Density)
pins: 1 K, 2 A

## ORANGE_LTST-C171KBKT
designator LD?, comment value ORANGE  Text2: C171  (hidden comment: LTST-C171KBKT)
LED SMD 0805 Orange; Manufacturer: LITEON; Reutech PN: 5961-LE-0108; Part Number: LTST-C171KBKT; Package: LED0805-Orange; EDM-PN: *; Text1: *; SAAB PN: *; DCE Part No: *
footprint LED0805-Orange (LED, 0805, 2-Leads, Body 2.0x1.3mm, IPC Medium Density)
pins: 1 K, 2 A

## ORANGE_ZUO55W-05
designator LD?, comment value ORANGE(0.5)  Text2: 1206  (hidden comment: Orange_1206_SMD-05)